# Altium schematic symbol library 13-Logicold 逻辑 IC.SchLib: 297 symbols (part 12 of 30)
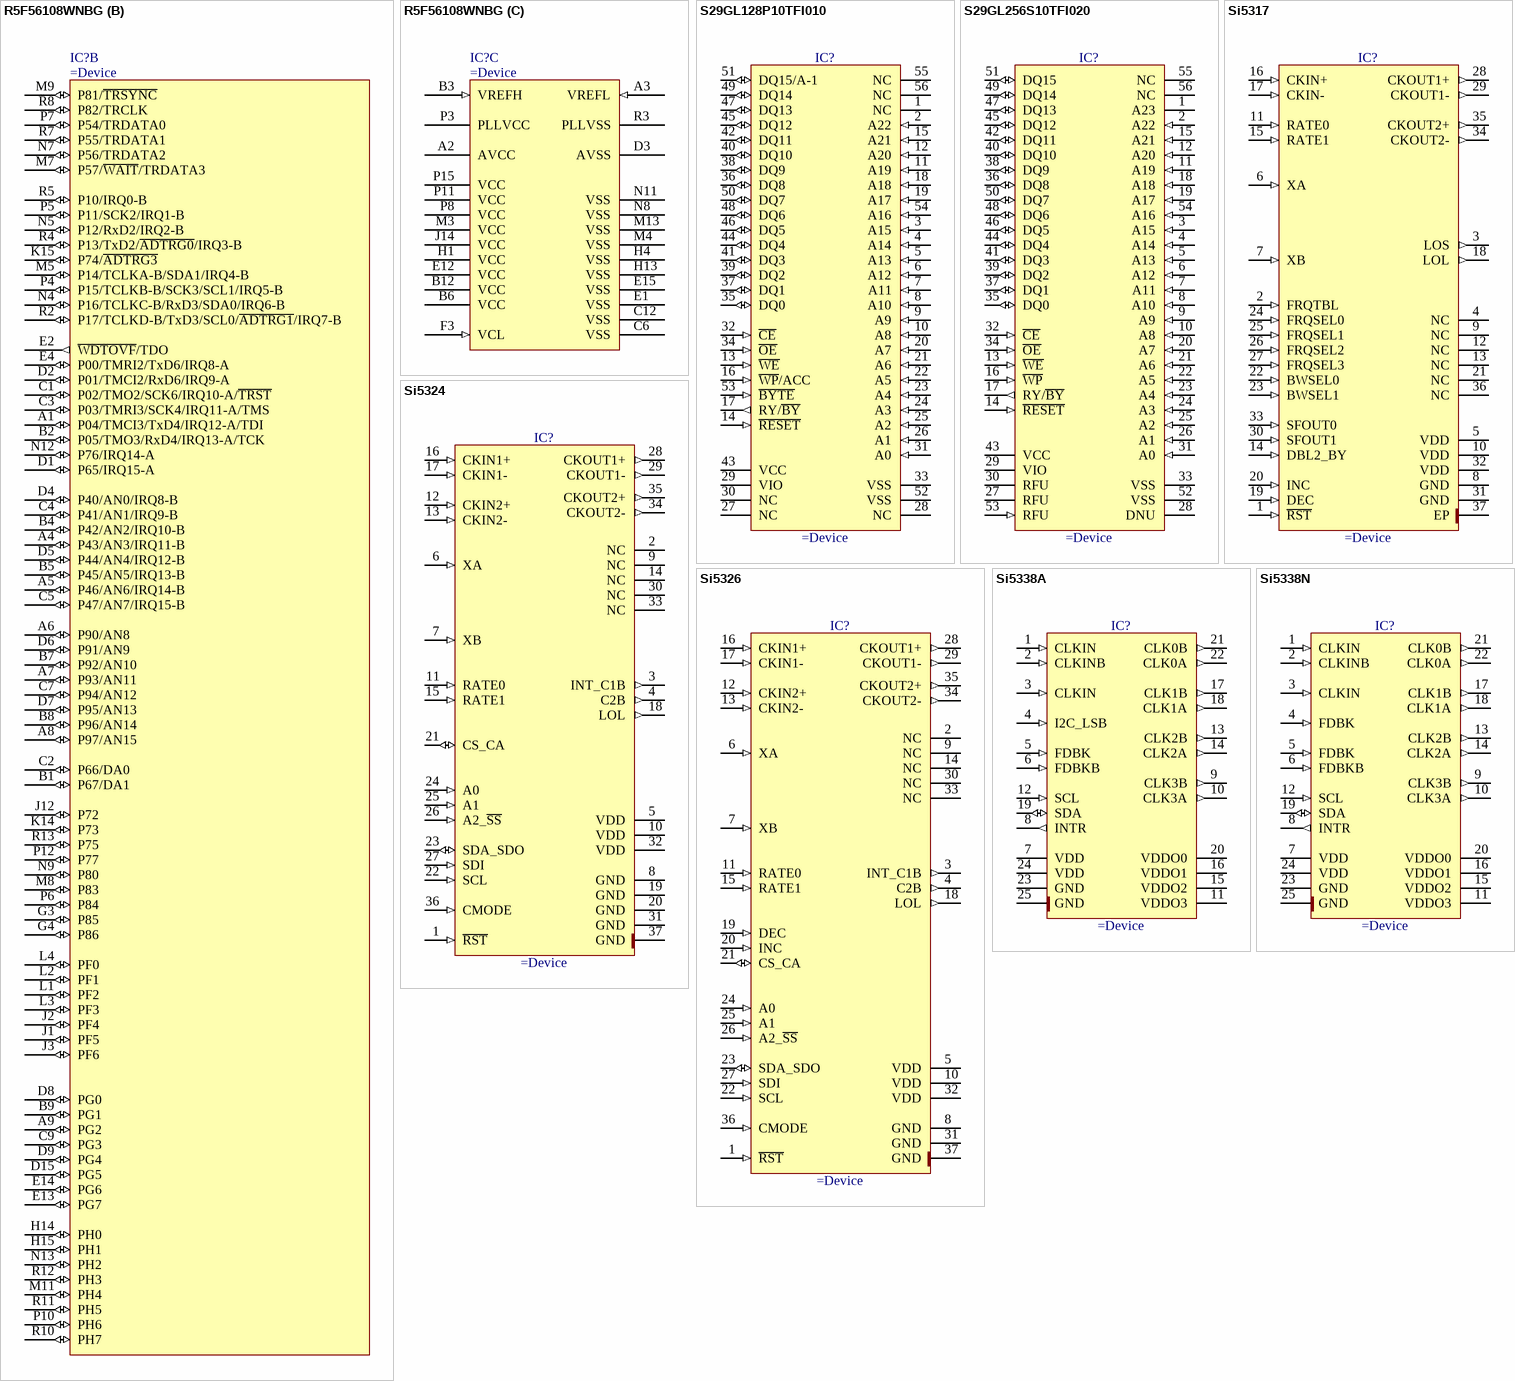
[diagram p173: symbols R5F56108WNBG to Si5338N]

## R5F56108WNBG
designator IC?
64-Bit, 2M ROM, 128K RAM, 32K Flash, 3V Microcontroller
part A pins: A10 PD1/D1 (io), A11 P60/~{CS0}/~{CS4}-A/~{CS5}-B (io), A12 P63/~{CS3}-A/~{CS7}-A (io), A13 PD4/D4 (io), A14 PD6/D6 (io), A15 PE0/D8 (io), B10 PD0/D0 (io), B11 P61/~{CS1}/~{CS2}-B/~{CS5}-A/~{CS6}-B/~{CS7}-B (io), B13 PD5/D5 (io), B14 PE1/D9 (io), B15 PE2/D10 (io), C8 BSCANP (in), C10 PD2/D2 (io), C11 P62/~{CS2}-A/~{CS6}-A (io), C13 PD7/D7 (io), C14 PE3/D11 (io), C15 PE5/D13/IRQ5-A (io), D10 PD3/D3 (io), D11 P64/~{CS4}-B (io), D12 PE4/D12 (io), D13 PE6/D14/IRQ6-A (io), D14 PE7/D15/IRQ7-A (io), E3 EMLE (in), F1 MD1 (in), F2 MD0 (in), F4 MDE (in), F12 PA3/A3/PO19/TIOCC6/TIOCD6/TCLKF (io), F13 PA2/A2/PO18/TIOCC6/TCLKE (io), F14 PA0/A0/~{BC0}/PO16/TIOCA6 (io), F15 PA1/A1/PO17/TIOCA6/TIOCB6 (io), G1 ~{RES} (in), G2 XTAL (in), G12 PA7/A7/PO23/TIOCA8/TIOCB8/TCLKH (io), G13 PA6/A6/PO22/TIOCA8 (io), G14 PA4/A4/PO20/TIOCA7 (io), G15 PA5/A5/PO21/TIOCA7/TIOCB7/TCLKG (io), H2 NMI (in), H3 EXTAL (in), H12 PB0/A8/PO24/TIOCA9 (io), J4 P34/PO12/TIOCA1/IRQ4-A (io), J13 P71/~{CS4}-C/~{CS5}-C/~{CS6}-C/~{CS7}-C (io), J15 P70/~{CS3}-B/~{ADTRG2} (io), K1 P31/PO9/TIOCA0/TIOCB0/IRQ1-A (io), K2 P30/PO8/TIOCA0/IRQ0-A (io), K3 P32/PO10/TIOCC0/TCLKA-A/IRQ2-A (io), K4 P33/PO11/TIOCC0/TIOCD0/TCLKB-A/IRQ3-A (io), K12 PB2/A10/PO26/TIOCC9 (io), K13 PB1/A9/PO25/TIOCA9/TIOCB9 (io), L12 PB7/A15/PO31/TIOCA11/TIOCB11 (io), L13 PB5/A13/PO29/TIOCA10/TIOCB10 (io), L14 PB4/A12/PO28/TIOCA10 (io), L15 PB3/A11/PO27/TIOCC9/TIOCD9 (io), M1 P27/PO7/TIOCA5/TIOCB5/SCK1 (io), M2 P26/PO6/TIOCA5/TMO1/TxD1 (io), M6 P37/PO15/TIOCA2/TIOCB2/TCLKD-A (io), M10 P51/~{WR1}/~{BC1} (io), M12 PC7/A23/TxD5/~{CS4}-D/~{CS7}-D (io), M14 PC0/A16 (io), M15 PB6/A14/PO30/TIOCA11 (io), N1 P25/PO5/TIOCA4/TMCI1/RxD1 (io), N2 P24/PO4/TIOCA4/TIOCB4/TMRI1 (io), N3 P20/PO0/TIOCA3/TIOCB3/TMRI0/TxD0 (io), N6 P36/PO14/TIOCA2 (io), N10 P50/~{WR0}/~{WR} (io), N14 PC2/A18 (io), N15 PC1/A17 (io), P1 P23/PO3/TIOCC3/TIOCD3 (io), P2 P22/PO2/TIOCC3/TMO0/SCK0 (io), P9 P52/~{RD} (io), P13 PC6/A22/RxD5/~{CS6}-D (io), P14 PC4/A20 (out), R1 P21/PO1/TIOCA3/TMCI0/RxD0 (io), R6 P35/PO13/TIOCA1/TIOCB1/TCLKC-A (io), R9 P53/BCLK (io), R14 PC5/A21/SCK5/~{CS5}-D (io), R15 PC3/A19 (io)
part B pins: A1 P04/TMCI3/TxD4/IRQ12-A/TDI (io), A4 P43/AN3/IRQ11-B (io), A5 P46/AN6/IRQ14-B (io), A6 P90/AN8 (io), A7 P93/AN11 (io), A8 P97/AN15 (io), A9 PG2 (io), B1 P67/DA1 (io), B2 P05/TMO3/RxD4/IRQ13-A/TCK (io), B4 P42/AN2/IRQ10-B (io), B5 P45/AN5/IRQ13-B (io), B7 P92/AN10 (io), B8 P96/AN14 (io), B9 PG1 (io), C1 P02/TMO2/SCK6/IRQ10-A/~{TRST} (io), C2 P66/DA0 (io), C3 P03/TMRI3/SCK4/IRQ11-A/TMS (io), C4 P41/AN1/IRQ9-B (io), C5 P47/AN7/IRQ15-B (io), C7 P94/AN12 (io), C9 PG3 (io), D1 P65/IRQ15-A (io), D2 P01/TMCI2/RxD6/IRQ9-A (io), D4 P40/AN0/IRQ8-B (io), D5 P44/AN4/IRQ12-B (io), D6 P91/AN9 (io), D7 P95/AN13 (io), D8 PG0 (io), D9 PG4 (io), D15 PG5 (io), E2 ~{WDTOVF}/TDO (out), E4 P00/TMRI2/TxD6/IRQ8-A (io), E13 PG7 (io), E14 PG6 (io), G3 P85 (io), G4 P86 (io), H14 PH0 (io), H15 PH1 (io), J1 PF5 (io), J2 PF4 (io), J3 PF6 (io), J12 P72 (io), K14 P73 (io), K15 P74/~{ADTRG3} (io), L1 PF2 (io), L2 PF1 (io), L3 PF3 (io), L4 PF0 (io), M5 P14/TCLKA-B/SDA1/IRQ4-B (io), M7 P57/~{WAIT}/TRDATA3 (io), M8 P83 (io), M9 P81/~{TRSYNC} (io), M11 PH4 (io), N4 P16/TCLKC-B/RxD3/SDA0/IRQ6-B (io), N5 P12/RxD2/IRQ2-B (io), N7 P56/TRDATA2 (io), N9 P80 (io), N12 P76/IRQ14-A (io), N13 PH2 (io), P4 P15/TCLKB-B/SCK3/SCL1/IRQ5-B (io), P5 P11/SCK2/IRQ1-B (io), P6 P84 (io), P7 P54/TRDATA0 (io), P10 PH6 (io), P12 P77 (io), R2 P17/TCLKD-B/TxD3/SCL0/~{ADTRG1}/IRQ7-B (io), R4 P13/TxD2/~{ADTRG0}/IRQ3-B (io), R5 P10/IRQ0-B (io), R7 P55/TRDATA1 (io), R8 P82/TRCLK (io), R10 PH7 (io), R11 PH5 (io), R12 PH3 (io), R13 P75 (io)
part C pins: A2 AVCC (power), A3 VREFL (in), B3 VREFH (in), B6 VCC (power), B12 VCC (power), C6 VSS (power), C12 VSS (power), D3 AVSS (power), E1 VSS (power), E12 VCC (power), E15 VSS (power), F3 VCL (in), H1 VCC (power), H4 VSS (power), H13 VSS (power), J14 VCC (power), M3 VCC (power), M4 VSS (power), M13 VSS (power), N8 VSS (power), N11 VSS (power), P3 PLLVCC (power), P8 VCC (power), P11 VCC (power), P15 VCC (power), R3 PLLVSS (power)

## S29GL128P10TFI010
designator IC?
2.7V to 3.6V, 100ns, 128 Megabit Flash Memory, 90 nm MirrorBit Process Technology
pins: 1 NC, 2 A22 (in), 3 A15 (in), 4 A14 (in), 5 A13 (in), 6 A12 (in), 7 A11 (in), 8 A10 (in), 9 A9 (in), 10 A8 (in), 11 A19 (in), 12 A20 (in), 13 ~{WE} (in), 14 ~{RESET} (in), 15 A21 (in), 16 ~{WP}/ACC (in), 17 RY/~{BY} (out), 18 A18 (in), 19 A17 (in), 20 A7 (in), 21 A6 (in), 22 A5 (in), 23 A4 (in), 24 A3 (in), 25 A2 (in), 26 A1 (in), 27 NC, 28 NC, 29 VIO (power), 30 NC, 31 A0 (in), 32 ~{CE} (in), 33 VSS (power), 34 ~{OE} (in), 35 DQ0 (io), 36 DQ8 (io), 37 DQ1 (io), 38 DQ9 (io), 39 DQ2 (io), 40 DQ10 (io), 41 DQ3 (io), 42 DQ11 (io), 43 VCC (power), 44 DQ4 (io), 45 DQ12 (io), 46 DQ5 (io), 47 DQ13 (io), 48 DQ6 (io), 49 DQ14 (io), 50 DQ7 (io), 51 DQ15/A-1 (io), 52 VSS (power), 53 ~{BYTE} (in), 54 A16 (in), 55 NC, 56 NC

## S29GL256S10TFI020
designator IC?
2.7V to 3.6V, 100ns, 256 Mbit (32Mbyte), MirrorBit Eclipse Flash Memory, 65nm  Process Technology
pins: 1 A23, 2 A22 (in), 3 A15 (in), 4 A14 (in), 5 A13 (in), 6 A12 (in), 7 A11 (in), 8 A10 (in), 9 A9 (in), 10 A8 (in), 11 A19 (in), 12 A20 (in), 13 ~{WE} (in), 14 ~{RESET} (in), 15 A21 (in), 16 ~{WP} (in), 17 RY/~{BY} (out), 18 A18 (in), 19 A17 (in), 20 A7 (in), 21 A6 (in), 22 A5 (in), 23 A4 (in), 24 A3 (in), 25 A2 (in), 26 A1 (in), 27 RFU, 28 DNU, 29 VIO (power), 30 RFU, 31 A0 (in), 32 ~{CE} (in), 33 VSS (power), 34 ~{OE} (in), 35 DQ0 (io), 36 DQ8 (io), 37 DQ1 (io), 38 DQ9 (io), 39 DQ2 (io), 40 DQ10 (io), 41 DQ3 (io), 42 DQ11 (io), 43 VCC (power), 44 DQ4 (io), 45 DQ12 (io), 46 DQ5 (io), 47 DQ13 (io), 48 DQ6 (io), 49 DQ14 (io), 50 DQ7 (io), 51 DQ15 (io), 52 VSS (power), 53 RFU (in), 54 A16 (in), 55 NC, 56 NC

## Si5317
designator IC?
Pin-Controlled Jitter Cleaning Clock
pins: 1 ~{RST} (in), 2 FRQTBL (in), 3 LOS (out), 4 NC, 5 VDD (power), 6 XA (in), 7 XB (in), 8 GND (power), 9 NC, 10 VDD (power), 11 RATE0 (in), 12 NC, 13 NC, 14 DBL2_BY (in), 15 RATE1 (in), 16 CKIN+ (in), 17 CKIN- (in), 18 LOL (out), 19 DEC (in), 20 INC (in), 21 NC, 22 BWSEL0 (in), 23 BWSEL1 (in), 24 FRQSEL0 (in), 25 FRQSEL1 (in), 26 FRQSEL2 (in), 27 FRQSEL3 (in), 28 CKOUT1+ (out), 29 CKOUT1- (out), 30 SFOUT1 (in), 31 GND (power), 32 VDD (power), 33 SFOUT0 (in), 34 CKOUT2- (out), 35 CKOUT2+ (out), 36 NC, 37 EP (power)

## Si5324
designator IC?
Any Frequency Precision Clock Multiplier/Jitter Attenuator
pins: 1 ~{RST} (in), 2 NC, 3 INT_C1B (out), 4 C2B (out), 5 VDD (power), 6 XA (in), 7 XB (in), 8 GND (power), 9 NC, 10 VDD (power), 11 RATE0 (in), 12 CKIN2+ (in), 13 CKIN2- (in), 14 NC, 15 RATE1 (in), 16 CKIN1+ (in), 17 CKIN1- (in), 18 LOL (out), 19 GND (power), 20 GND (power), 21 CS_CA (io), 22 SCL (in), 23 SDA_SDO (io), 24 A0 (in), 25 A1 (in), 26 A2_~{SS} (in), 27 SDI (in), 28 CKOUT1+ (out), 29 CKOUT1- (out), 30 NC, 31 GND (power), 32 VDD (power), 33 NC, 34 CKOUT2- (out), 35 CKOUT2+ (out), 36 CMODE (in), 37 GND (power)

## Si5326
designator IC?
Any Frequency Precision Clock Multiplier/Jitter Attenuator
pins: 1 ~{RST} (in), 2 NC, 3 INT_C1B (out), 4 C2B (out), 5 VDD (power), 6 XA (in), 7 XB (in), 8 GND (power), 9 NC, 10 VDD (power), 11 RATE0 (in), 12 CKIN2+ (in), 13 CKIN2- (in), 14 NC, 15 RATE1 (in), 16 CKIN1+ (in), 17 CKIN1- (in), 18 LOL (out), 19 DEC (in), 20 INC (in), 21 CS_CA (io), 22 SCL (in), 23 SDA_SDO (io), 24 A0 (in), 25 A1 (in), 26 A2_~{SS} (in), 27 SDI (in), 28 CKOUT1+ (out), 29 CKOUT1- (out), 30 NC, 31 GND (power), 32 VDD (power), 33 NC, 34 CKOUT2- (out), 35 CKOUT2+ (out), 36 CMODE (in), 37 GND (power)

## Si5338A
designator IC?
I2C-Programmable Any-Frequency, Any-Output Quad Clock Generator
pins: 1 CLKIN (in), 2 CLKINB (in), 3 CLKIN (in), 4 I2C_LSB (in), 5 FDBK (in), 6 FDBKB (in), 7 VDD (power), 8 INTR (out), 9 CLK3B (out), 10 CLK3A (out), 11 VDDO3 (power), 12 SCL (in), 13 CLK2B (out), 14 CLK2A (out), 15 VDDO2 (power), 16 VDDO1 (power), 17 CLK1B (out), 18 CLK1A (out), 19 SDA (io), 20 VDDO0 (power), 21 CLK0B (out), 22 CLK0A (out), 23 GND (power), 24 VDD (power), 25 GND (power)

## Si5338N
designator IC?
I2C-Programmable Any-Frequency, Any-Output Quad Clock Generator
pins: 1 CLKIN (in), 2 CLKINB (in), 3 CLKIN (in), 4 FDBK (in), 5 FDBK (in), 6 FDBKB (in), 7 VDD (power), 8 INTR (out), 9 CLK3B (out), 10 CLK3A (out), 11 VDDO3 (power), 12 SCL (in), 13 CLK2B (out), 14 CLK2A (out), 15 VDDO2 (power), 16 VDDO1 (power), 17 CLK1B (out), 18 CLK1A (out), 19 SDA (io), 20 VDDO0 (power), 21 CLK0B (out), 22 CLK0A (out), 23 GND (power), 24 VDD (power), 25 GND (power)

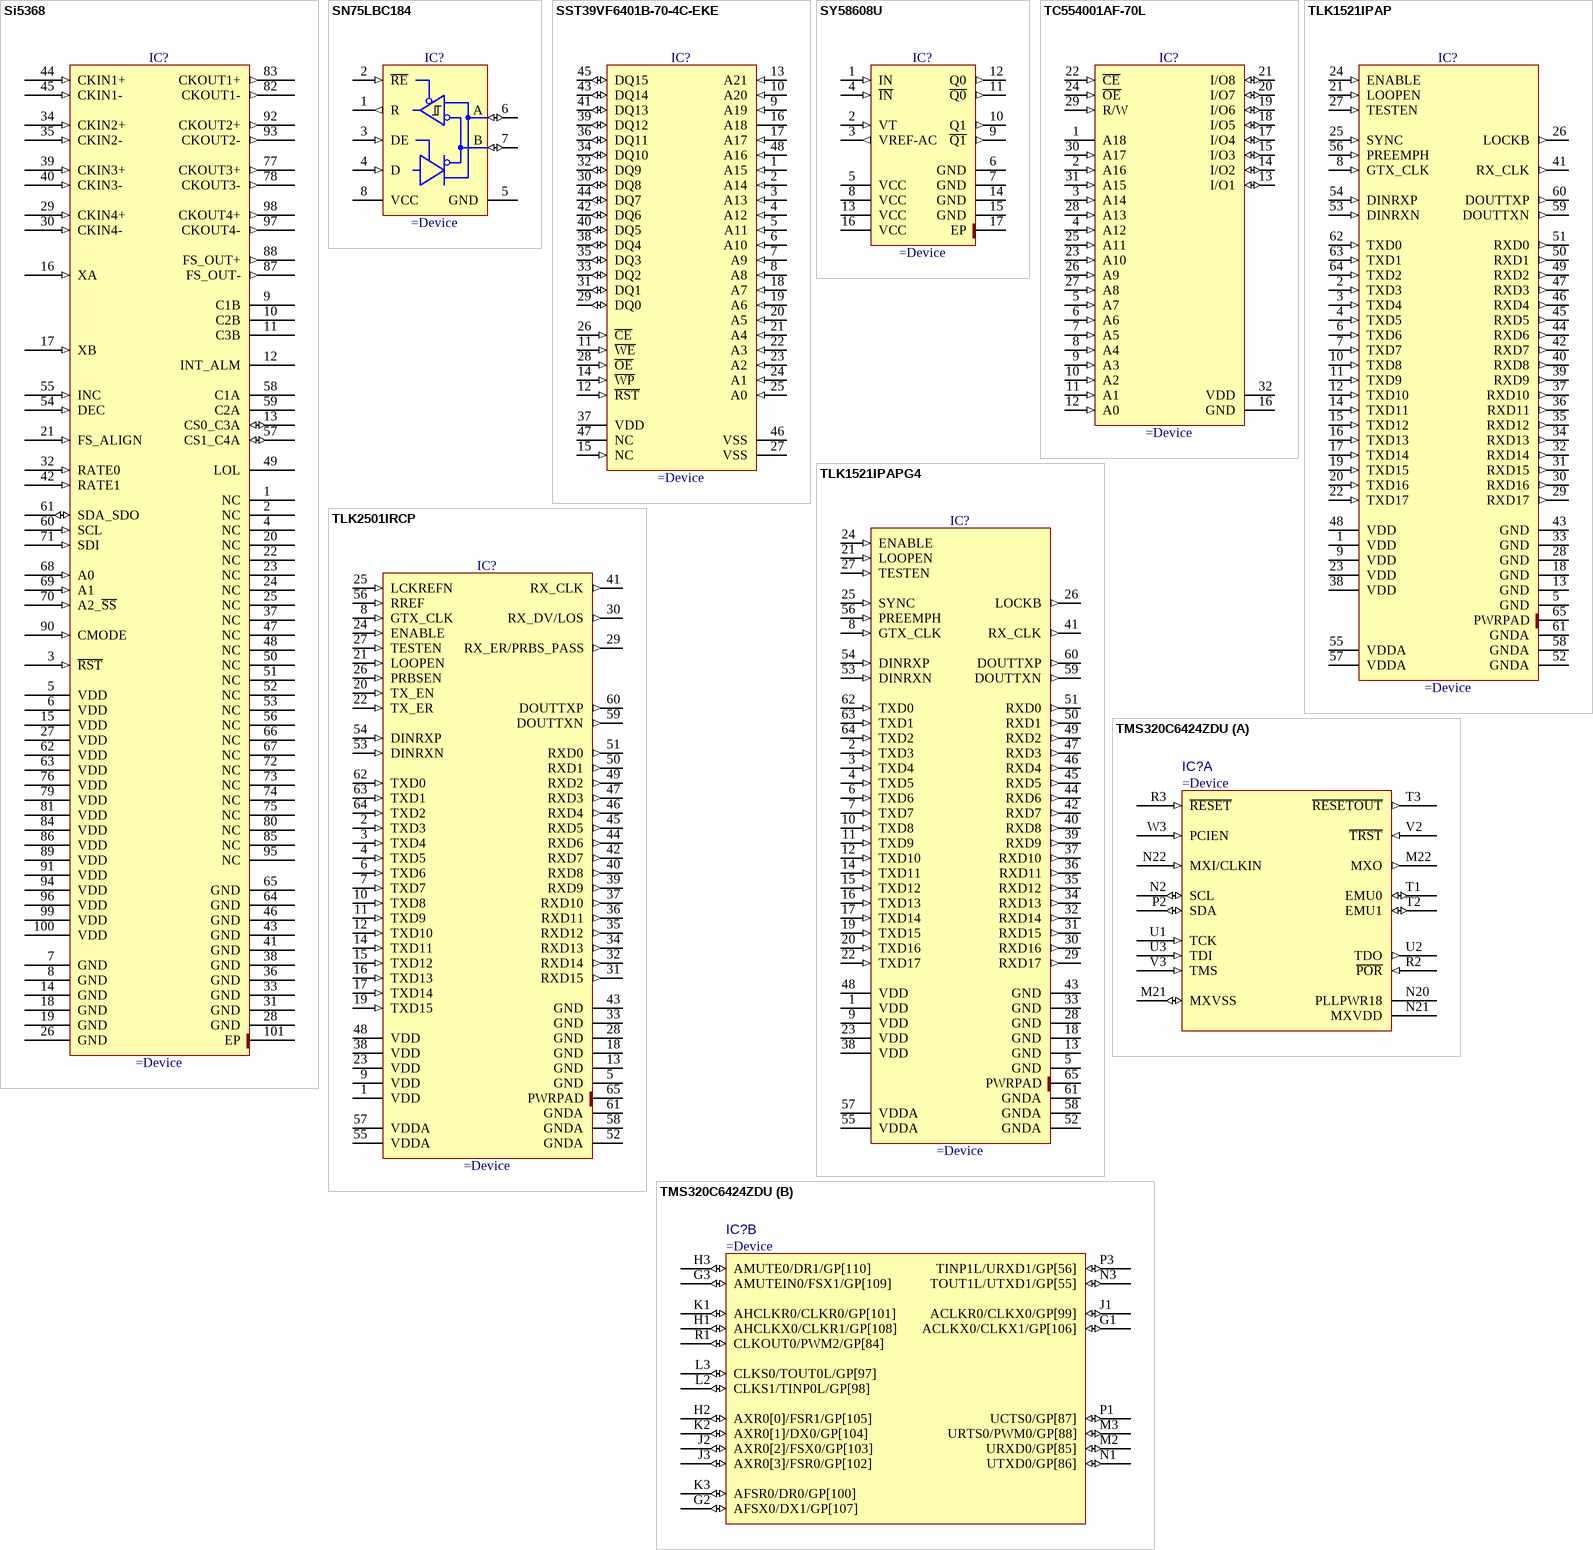
[diagram p71: symbols Si5368 to TMS320C6424ZDU]

## Si5368
designator IC?
Any-Frequency Precision Clock Multiplier/Jitter Attenuator
pins: 1 NC "No Connect", 2 NC "No Connect", 3 ~{RST} (in) "External Reset", 4 NC "No Connect", 5 VDD (power), 6 VDD (power), 7 GND (power) "Ground.", 8 GND (power) "Ground.", 9 C1B (hiz) "CKIN1 Invalid Indicator", 10 C2B (hiz) "CKIN2 Invalid Indicator.", 11 C3B (hiz) "CKIN3 Invalid Indicator.", 12 INT_ALM (hiz) "Interrupt/Alarm Output Indicator", 13 CS0_C3A (io) "Input Clock Select/CKINn Active Clock Indicator", 14 GND (power) "Ground.", 15 VDD (power), 16 XA (in) "External Crystal or Reference Clock", 17 XB (in) "External Crystal or Reference Clock", 18 GND (power) "Ground.", 19 GND (power) "Ground.", 20 NC "No Connect", 21 FS_ALIGN (in) "FSYNC Alignment Control", 22 NC "No Connect.", 23 NC "No Connect.", 24 NC "No Connect.", 25 NC "No Connect.", 26 GND (power) "Ground.", 27 VDD (power), 28 GND (power) "Ground.", 29 CKIN4+ (in) "Clock Input 4.", 30 CKIN4- (in) "Clock Input 4.", 31 GND (power) "Ground.", 32 RATE0 (in) "External Crystal or Reference Clock Rate.", 33 GND (power) "Ground.", 34 CKIN2+ (in) "Clock Input 2.", 35 CKIN2- (in) "Clock Input 2.", 36 GND (power) "Ground.", 37 NC "No Connect.", 38 GND (power) "Ground.", 39 CKIN3+ (in) "Clock Input 3.", 40 CKIN3- (in) "Clock Input 3.", 41 GND (power) "Ground.", 42 RATE1 (in) "External Crystal or Reference Clock Rate.", 43 GND (power) "Ground.", 44 CKIN1+ (in) "Clock Input 1.", 45 CKIN1- (in) "Clock Input 1.", 46 GND (power) "Ground.", 47 NC "No Connect.", 48 NC "No Connect.", 49 LOL (hiz) "PLL Loss of Lock Indicator.", 50 NC "No Connect.", 51 NC "No Connect.", 52 NC "No Connect.", 53 NC "No Connect.", 54 DEC (in) "Coarse Skew Decrement.", 55 INC (in) "Coarse Skew Increment.", 56 NC "No Connect.", 57 CS1_C4A (io) "Input Clock Select/CKINn Active Clock Indicator", 58 C1A (hiz) "CKIN1 Active Clock Indicator", 59 C2A (hiz) "CKIN2 Active Clock Indicator.", 60 SCL (in) "Serial Clock.", 61 SDA_SDO (io) "Serial Data.", 62 VDD (power), 63 VDD (power), 64 GND (power) "Ground.", 65 GND (power) "Ground.", 66 NC "No Connect.", 67 NC "No Connect.", 68 A0 (in) "Serial Port Address.", 69 A1 (in) "Serial Port Address.", 70 A2_~{SS} (in) "Serial Port Address/S\l\a\v\e\ \S\e\l\e\c\t\", 71 SDI (in) "Serial Data In.", 72 NC "No Connect.", 73 NC "No Connect.", 74 NC "No Connect.", 75 NC "No Connect.", 76 VDD (power), 77 CKOUT3+ (out) "Clock Output 3.", 78 CKOUT3- (out) "Clock Output 3.", 79 VDD (power) "VDD.", 80 NC "No Connect.", 81 VDD (power) "VDD.", 82 CKOUT1- (out) "Clock Output 1.", 83 CKOUT1+ (out) "Clock Output 1.", 84 VDD (power) "VDD.", 85 NC "No Connect.", 86 VDD (power), 87 FS_OUT- (out) "Frame Sync Output.", 88 FS_OUT+ (out) "Frame Sync Output.", 89 VDD (power) "VDD.", 90 CMODE (in) "Control Mode", 91 VDD (power), 92 CKOUT2+ (out) "Clock Output 2.", 93 CKOUT2- (out) "Clock Output 2.", 94 VDD (power) "VDD.", 95 NC "No Connect.", 96 VDD (power) "VDD.", 97 CKOUT4- (out) "Clock Output 4.", 98 CKOUT4+ (out) "Clock Output 4.", 99 VDD (power) "VDD.", 100 VDD (power) "VDD.", 101 EP (power) "Ground Pad"

## SN75LBC184
designator IC?
Differential Transceiver with Transient Voltage Suppression
pins: 1 R (out), 2 ~{RE} (in), 3 DE (in), 4 D (in), 5 GND (power), 6 A (io), 7 B (io), 8 VCC (power)

## SST39VF6401B-70-4C-EKE
designator IC?
4M x 16 (64 Mbit), 2.7V Multi-Purpose Flash Plus
pins: 1 A15 (in), 2 A14 (in), 3 A13 (in), 4 A12 (in), 5 A11 (in), 6 A10 (in), 7 A9 (in), 8 A8 (in), 9 A19 (in), 10 A20 (in), 11 ~{WE} (in), 12 ~{RST} (in), 13 A21 (in), 14 ~{WP} (in), 15 NC (in), 16 A18, 17 A17 (in), 18 A7 (in), 19 A6 (in), 20 A5 (in), 21 A4 (in), 22 A3 (in), 23 A2 (in), 24 A1 (in), 25 A0 (in), 26 ~{CE} (in), 27 VSS (power), 28 ~{OE} (in), 29 DQ0 (io), 30 DQ8 (io), 31 DQ1 (io), 32 DQ9 (io), 33 DQ2 (io), 34 DQ10 (io), 35 DQ3 (io), 36 DQ11 (io), 37 VDD (power), 38 DQ4 (io), 39 DQ12 (io), 40 DQ5 (io), 41 DQ13 (io), 42 DQ6 (io), 43 DQ14 (io), 44 DQ7 (io), 45 DQ15 (io), 46 VSS (power), 47 NC, 48 A16 (in)

## SY58608U
designator IC?
3.2Gbps Precision, 1:2 LVDS Fanout Buffer With Internal Termination And Fail Safe Input
pins: 1 IN (in), 2 VT (in), 3 VREF-AC (out), 4 ~{IN} (in), 5 VCC (power), 6 GND (power), 7 GND (power), 8 VCC (power), 9 ~{Q1} (out), 10 Q1 (out), 11 ~{Q0} (out), 12 Q0 (out), 13 VCC (power), 14 GND (power), 15 GND (power), 16 VCC (power), 17 EP (power)

## TC554001AF-70L
designator IC?
524,288-Word by 8-Bit Static RAM
pins: 1 A18, 2 A16 (in), 3 A14 (in), 4 A12 (in), 5 A7 (in), 6 A6 (in), 7 A5 (in), 8 A4 (in), 9 A3 (in), 10 A2 (in), 11 A1 (in), 12 A0 (in), 13 I/O1 (io), 14 I/O2 (io), 15 I/O3 (io), 16 GND (power), 17 I/O4 (io), 18 I/O5 (io), 19 I/O6 (io), 20 I/O7 (io), 21 I/O8 (io), 22 ~{CE} (in), 23 A10 (in), 24 ~{OE} (in), 25 A11 (in), 26 A9 (in), 27 A8 (in), 28 A13 (in), 29 R/W (in), 30 A17 (in), 31 A15 (in), 32 VDD (power)

## TLK1521IPAP
designator IC?
500Mbps to 1.3Gbps Transceiver
pins: 1 VDD (power), 2 TXD3 (in), 3 TXD4 (in), 4 TXD5 (in), 5 GND (power), 6 TXD6 (in), 7 TXD7 (in), 8 GTX_CLK (in), 9 VDD (power), 10 TXD8 (in), 11 TXD9 (in), 12 TXD10 (in), 13 GND (power), 14 TXD11 (in), 15 TXD12 (in), 16 TXD13 (in), 17 TXD14 (in), 18 GND (power), 19 TXD15 (in), 20 TXD16 (in), 21 LOOPEN (in), 22 TXD17 (in), 23 VDD (power), 24 ENABLE (in), 25 SYNC (in), 26 LOCKB (out), 27 TESTEN (in), 28 GND (power), 29 RXD17 (out), 30 RXD16 (out), 31 RXD15 (out), 32 RXD14 (out), 33 GND (power), 34 RXD13 (out), 35 RXD12 (out), 36 RXD11 (out), 37 RXD10 (out), 38 VDD (power), 39 RXD9 (out), 40 RXD8 (out), 41 RX_CLK (out), 42 RXD7 (out), 43 GND (power), 44 RXD6 (out), 45 RXD5 (out), 46 RXD4 (out), 47 RXD3 (out), 48 VDD (power), 49 RXD2 (out), 50 RXD1 (out), 51 RXD0 (out), 52 GNDA (power), 53 DINRXN (in), 54 DINRXP (in), 55 VDDA (power), 56 PREEMPH (in), 57 VDDA (power), 58 GNDA (power), 59 DOUTTXN (out), 60 DOUTTXP (out), 61 GNDA (power), 62 TXD0 (in), 63 TXD1 (in), 64 TXD2 (in), 65 PWRPAD (power)

## TLK1521IPAPG4
designator IC?
500Mbps to 1.3Gbps Transceiver
pins: 1 VDD (power), 2 TXD3 (in), 3 TXD4 (in), 4 TXD5 (in), 5 GND (power), 6 TXD6 (in), 7 TXD7 (in), 8 GTX_CLK (in), 9 VDD (power), 10 TXD8 (in), 11 TXD9 (in), 12 TXD10 (in), 13 GND (power), 14 TXD11 (in), 15 TXD12 (in), 16 TXD13 (in), 17 TXD14 (in), 18 GND (power), 19 TXD15 (in), 20 TXD16 (in), 21 LOOPEN (in), 22 TXD17 (in), 23 VDD (power), 24 ENABLE (in), 25 SYNC (in), 26 LOCKB (out), 27 TESTEN (in), 28 GND (power), 29 RXD17 (out), 30 RXD16 (out), 31 RXD15 (out), 32 RXD14 (out), 33 GND (power), 34 RXD13 (out), 35 RXD12 (out), 36 RXD11 (out), 37 RXD10 (out), 38 VDD (power), 39 RXD9 (out), 40 RXD8 (out), 41 RX_CLK (out), 42 RXD7 (out), 43 GND (power), 44 RXD6 (out), 45 RXD5 (out), 46 RXD4 (out), 47 RXD3 (out), 48 VDD (power), 49 RXD2 (out), 50 RXD1 (out), 51 RXD0 (out), 52 GNDA (power), 53 DINRXN (in), 54 DINRXP (in), 55 VDDA (power), 56 PREEMPH (in), 57 VDDA (power), 58 GNDA (power), 59 DOUTTXN (out), 60 DOUTTXP (out), 61 GNDA (power), 62 TXD0 (in), 63 TXD1 (in), 64 TXD2 (in), 65 PWRPAD (power)

## TLK2501IRCP
designator IC?
1.5 to 2.5 Gbps Transceiver
pins: 1 VDD (power), 2 TXD3 (in), 3 TXD4 (in), 4 TXD5 (in), 5 GND (power), 6 TXD6 (in), 7 TXD7 (in), 8 GTX_CLK (in), 9 VDD (power), 10 TXD8 (in), 11 TXD9 (in), 12 TXD10 (in), 13 GND (power), 14 TXD11 (in), 15 TXD12 (in), 16 TXD13 (in), 17 TXD14 (in), 18 GND (power), 19 TXD15 (in), 20 TX_EN (in), 21 LOOPEN (in), 22 TX_ER (in), 23 VDD (power), 24 ENABLE (in), 25 LCKREFN (in), 26 PRBSEN (in), 27 TESTEN (in), 28 GND (power), 29 RX_ER/PRBS_PASS (out), 30 RX_DV/LOS (out), 31 RXD15 (out), 32 RXD14 (out), 33 GND (power), 34 RXD13 (out), 35 RXD12 (out), 36 RXD11 (out), 37 RXD10 (out), 38 VDD (power), 39 RXD9 (out), 40 RXD8 (out), 41 RX_CLK (out), 42 RXD7 (out), 43 GND (power), 44 RXD6 (out), 45 RXD5 (out), 46 RXD4 (out), 47 RXD3 (out), 48 VDD (power), 49 RXD2 (out), 50 RXD1 (out), 51 RXD0 (out), 52 GNDA (power), 53 DINRXN (in), 54 DINRXP (in), 55 VDDA (power), 56 RREF (in), 57 VDDA (power), 58 GNDA (power), 59 DOUTTXN (out), 60 DOUTTXP (out), 61 GNDA (power), 62 TXD0 (in), 63 TXD1 (in), 64 TXD2 (in), 65 PWRPAD (power)

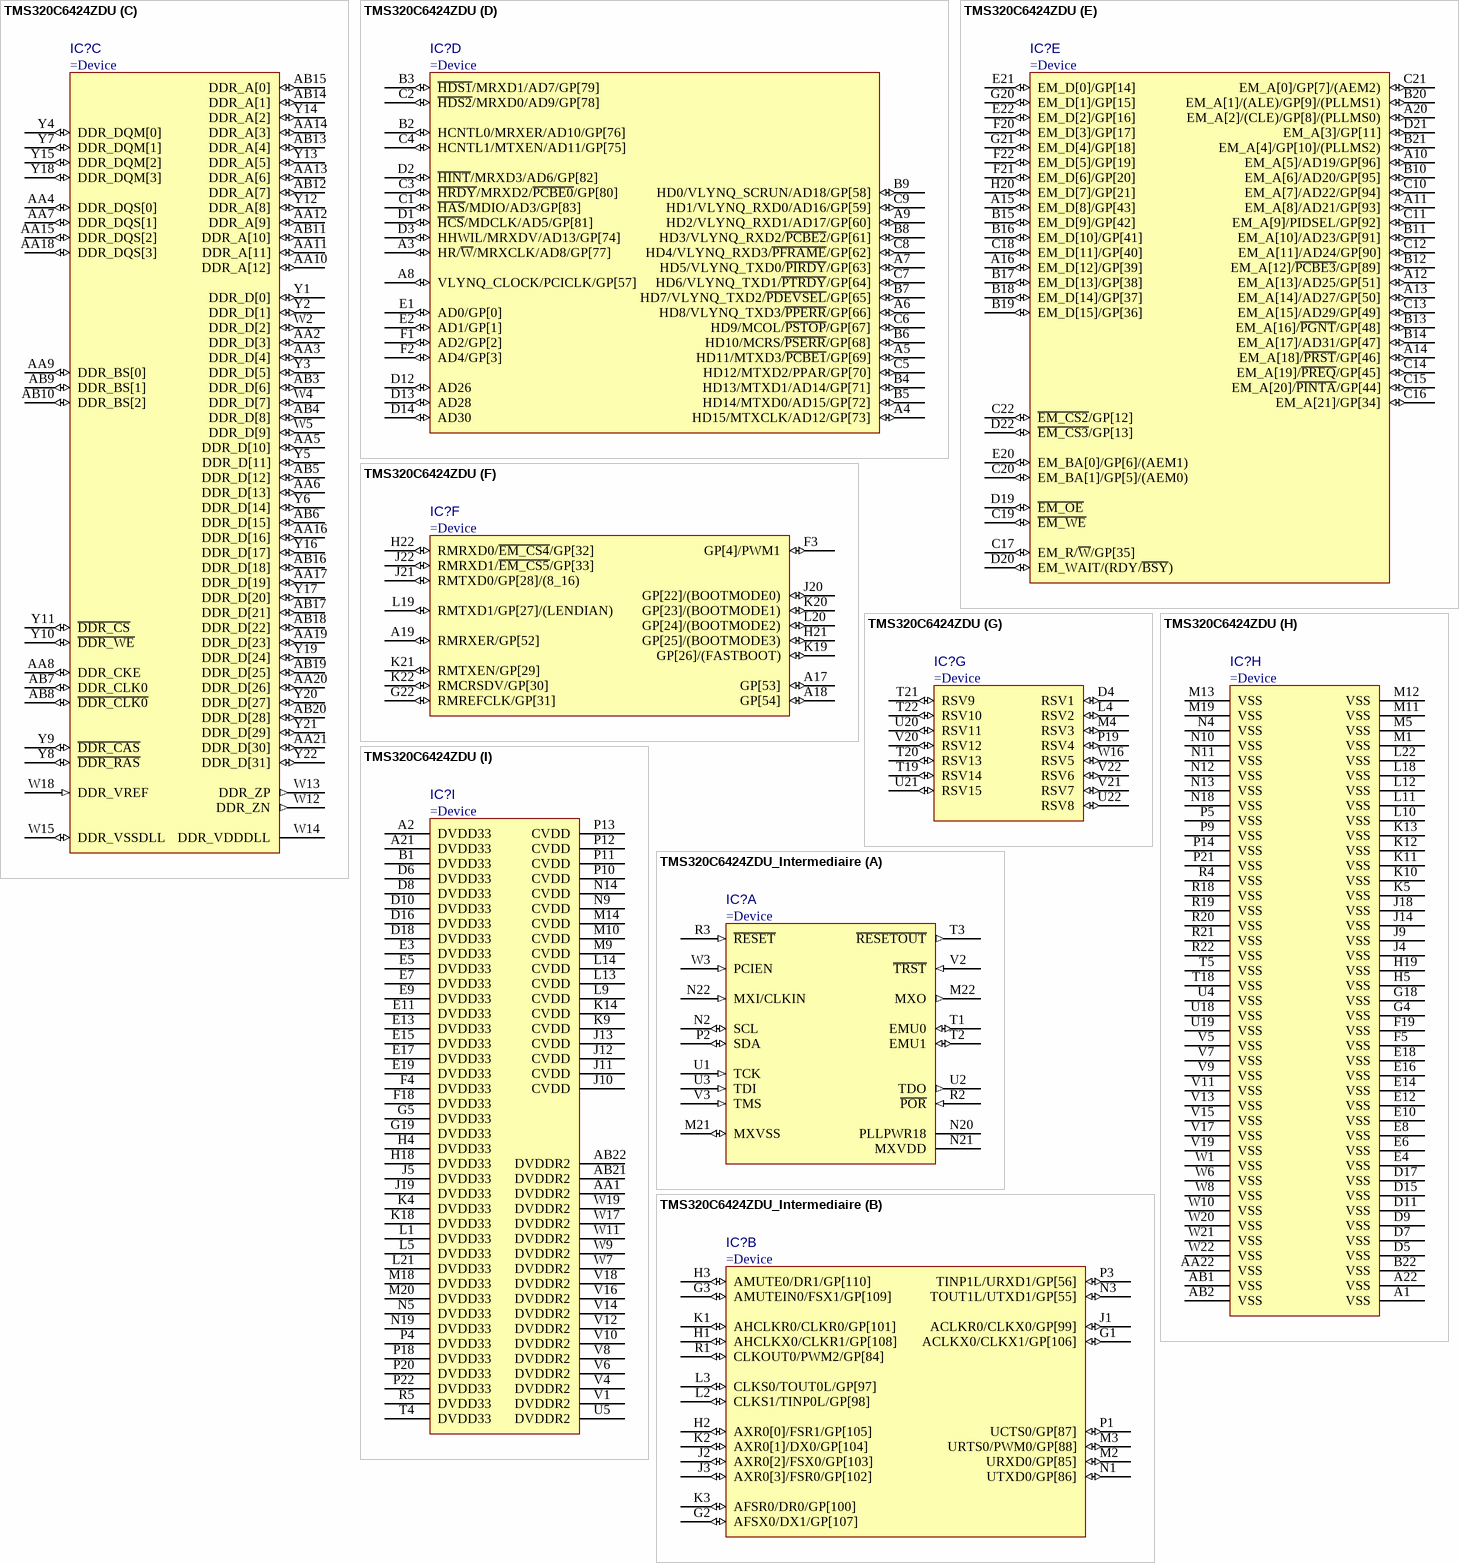
[diagram p72: symbols TMS320C6424ZDU to TMS320C6424ZDU_Intermediaire]

## TMS320C6424ZDU
designator IC?
Fixed-Point Digital Signal Processor (DSP)
part A pins: M21 MXVSS (io), M22 MXO (out), N2 SCL (io), N20 PLLPWR18 (power), N21 MXVDD (power), N22 MXI/CLKIN (in), P2 SDA (io), R2 ~{POR} (in), R3 ~{RESET} (in), T1 EMU0 (io), T2 EMU1 (io), T3 ~{RESETOUT} (out), U1 TCK (in), U2 TDO (out), U3 TDI (in), V2 ~{TRST} (in), V3 TMS (in), W3 PCIEN (in)
part B pins: G1 ACLKX0/CLKX1/GP[106] (io), G2 AFSX0/DX1/GP[107] (io), G3 AMUTEIN0/FSX1/GP[109] (io), H1 AHCLKX0/CLKR1/GP[108] (io), H2 AXR0[0]/FSR1/GP[105] (io), H3 AMUTE0/DR1/GP[110] (io), J1 ACLKR0/CLKX0/GP[99] (io), J2 AXR0[2]/FSX0/GP[103] (io), J3 AXR0[3]/FSR0/GP[102] (io), K1 AHCLKR0/CLKR0/GP[101] (io), K2 AXR0[1]/DX0/GP[104] (io), K3 AFSR0/DR0/GP[100] (io), L2 CLKS1/TINP0L/GP[98] (io), L3 CLKS0/TOUT0L/GP[97] (io), M2 URXD0/GP[85] (io), M3 URTS0/PWM0/GP[88] (io), N1 UTXD0/GP[86] (io), N3 TOUT1L/UTXD1/GP[55] (io), P1 UCTS0/GP[87] (io), P3 TINP1L/URXD1/GP[56] (io), R1 CLKOUT0/PWM2/GP[84] (io)
part C pins: AA2 DDR_D[3] (io), AA3 DDR_D[4] (io), AA4 DDR_DQS[0] (io), AA5 DDR_D[10] (io), AA6 DDR_D[13] (io), AA7 DDR_DQS[1] (io), AA8 DDR_CKE (io), AA9 DDR_BS[0] (io), AA10 DDR_A[12] (io), AA11 DDR_A[11] (io), AA12 DDR_A[9] (io), AA13 DDR_A[6] (io), AA14 DDR_A[3] (io), AA15 DDR_DQS[2] (io), AA16 DDR_D[16] (io), AA17 DDR_D[19] (io), AA18 DDR_DQS[3] (io), AA19 DDR_D[23] (io), AA20 DDR_D[26] (io), AA21 DDR_D[30] (io), AB3 DDR_D[6] (io), AB4 DDR_D[8] (io), AB5 DDR_D[12] (io), AB6 DDR_D[15] (io), AB7 DDR_CLK0 (io), AB8 ~{DDR_CLK0} (io), AB9 DDR_BS[1] (io), AB10 DDR_BS[2] (io), AB11 DDR_A[10] (io), AB12 DDR_A[7] (io), AB13 DDR_A[4] (io), AB14 DDR_A[1] (io), AB15 DDR_A[0] (io), AB16 DDR_D[18] (io), AB17 DDR_D[21] (io), AB18 DDR_D[22] (io), AB19 DDR_D[25] (io), AB20 DDR_D[28] (io), W2 DDR_D[2] (io), W4 DDR_D[7] (io), W5 DDR_D[9] (io), W12 DDR_ZN (out), W13 DDR_ZP (out), W14 DDR_VDDDLL (power), W15 DDR_VSSDLL (io), W18 DDR_VREF (in), Y1 DDR_D[0] (io), Y2 DDR_D[1] (io), Y3 DDR_D[5] (io), Y4 DDR_DQM[0] (io), Y5 DDR_D[11] (io), Y6 DDR_D[14] (io), Y7 DDR_DQM[1] (io), Y8 ~{DDR_RAS} (io), Y9 ~{DDR_CAS} (io), Y10 ~{DDR_WE} (io), Y11 ~{DDR_CS} (io), Y12 DDR_A[8] (io), Y13 DDR_A[5] (io), Y14 DDR_A[2] (io), Y15 DDR_DQM[2] (io), Y16 DDR_D[17] (io), Y17 DDR_D[20] (io), Y18 DDR_DQM[3] (io), Y19 DDR_D[24] (io), Y20 DDR_D[27] (io), Y21 DDR_D[29] (io), Y22 DDR_D[31] (io)
part D pins: A3 HR/~{W}/MRXCLK/AD8/GP[77] (io), A4 HD15/MTXCLK/AD12/GP[73] (io), A5 HD11/MTXD3/~{PCBE1}/GP[69] (io), A6 HD8/VLYNQ_TXD3/~{PPERR}/GP[66] (io), A7 HD5/VLYNQ_TXD0/~{PIRDY}/GP[63] (io), A8 VLYNQ_CLOCK/PCICLK/GP[57] (io), A9 HD2/VLYNQ_RXD1/AD17/GP[60] (io), B2 HCNTL0/MRXER/AD10/GP[76] (io), B3 ~{HDS1}/MRXD1/AD7/GP[79] (io), B4 HD13/MTXD1/AD14/GP[71] (io), B5 HD14/MTXD0/AD15/GP[72] (io), B6 HD10/MCRS/~{PSERR}/GP[68] (io), B7 HD7/VLYNQ_TXD2/~{PDEVSEL}/GP[65] (io), B8 HD3/VLYNQ_RXD2/~{PCBE2}/GP[61] (io), B9 HD0/VLYNQ_SCRUN/AD18/GP[58] (io), C1 ~{HAS}/MDIO/AD3/GP[83] (io), C2 ~{HDS2}/MRXD0/AD9/GP[78] (io), C3 ~{HRDY}/MRXD2/~{PCBE0}/GP[80] (io), C4 HCNTL1/MTXEN/AD11/GP[75] (io), C5 HD12/MTXD2/PPAR/GP[70] (io), C6 HD9/MCOL/~{PSTOP}/GP[67] (io), C7 HD6/VLYNQ_TXD1/~{PTRDY}/GP[64] (io), C8 HD4/VLYNQ_RXD3/~{PFRAME}/GP[62] (io), C9 HD1/VLYNQ_RXD0/AD16/GP[59] (io), D1 ~{HCS}/MDCLK/AD5/GP[81] (io), D2 ~{HINT}/MRXD3/AD6/GP[82] (io), D3 HHWIL/MRXDV/AD13/GP[74] (io), D12 AD26 (io), D13 AD28 (io), D14 AD30 (io), E1 AD0/GP[0] (io), E2 AD1/GP[1] (io), F1 AD2/GP[2] (io), F2 AD4/GP[3] (io)
part E pins: A10 EM_A[5]/AD19/GP[96] (io), A11 EM_A[8]/AD21/GP[93] (io), A12 EM_A[13]/AD25/GP[51] (io), A13 EM_A[14]/AD27/GP[50] (io), A14 EM_A[18]/~{PRST}/GP[46] (io), A15 EM_D[8]/GP[43] (io), A16 EM_D[12]/GP[39] (io), A20 EM_A[2]/(CLE)/GP[8]/(PLLMS0) (io), B10 EM_A[6]/AD20/GP[95] (io), B11 EM_A[10]/AD23/GP[91] (io), B12 EM_A[12]/~{PCBE3}/GP[89] (io), B13 EM_A[16]/~{PGNT}/GP[48] (io), B14 EM_A[17]/AD31/GP[47] (io), B15 EM_D[9]/GP[42] (io), B16 EM_D[10]/GP[41] (io), B17 EM_D[13]/GP[38] (io), B18 EM_D[14]/GP[37] (io), B19 EM_D[15]/GP[36] (io), B20 EM_A[1]/(ALE)/GP[9]/(PLLMS1) (io), B21 EM_A[4]/GP[10]/(PLLMS2) (io), C10 EM_A[7]/AD22/GP[94] (io), C11 EM_A[9]/PIDSEL/GP[92] (io), C12 EM_A[11]/AD24/GP[90] (io), C13 EM_A[15]/AD29/GP[49] (io), C14 EM_A[19]/~{PREQ}/GP[45] (io), C15 EM_A[20]/~{PINTA}/GP[44] (io), C16 EM_A[21]/GP[34] (io), C17 EM_R/~{W}/GP[35] (io), C18 EM_D[11]/GP[40] (io), C19 ~{EM_WE} (io), C20 EM_BA[1]/GP[5]/(AEM0) (io), C21 EM_A[0]/GP[7]/(AEM2) (io), C22 ~{EM_CS2}/GP[12] (io), D19 ~{EM_OE} (io), D20 EM_WAIT/(RDY/~{BSY}) (io), D21 EM_A[3]/GP[11] (io), D22 ~{EM_CS3}/GP[13] (io), E20 EM_BA[0]/GP[6]/(AEM1) (io), E21 EM_D[0]/GP[14] (io), E22 EM_D[2]/GP[16] (io), F20 EM_D[3]/GP[17] (io), F21 EM_D[6]/GP[20] (io), F22 EM_D[5]/GP[19] (io), G20 EM_D[1]/GP[15] (io), G21 EM_D[4]/GP[18] (io), H20 EM_D[7]/GP[21] (io)
part F pins: A17 GP[53] (io), A18 GP[54] (io), A19 RMRXER/GP[52] (io), F3 GP[4]/PWM1 (io), G22 RMREFCLK/GP[31] (io), H21 GP[25]/(BOOTMODE3) (io), H22 RMRXD0/~{EM_CS4}/GP[32] (io), J20 GP[22]/(BOOTMODE0) (io), J21 RMTXD0/GP[28]/(8_16) (io), J22 RMRXD1/~{EM_CS5}/GP[33] (io), K19 GP[26]/(FASTBOOT) (io), K20 GP[23]/(BOOTMODE1) (io), K21 RMTXEN/GP[29] (io), K22 RMCRSDV/GP[30] (io), L19 RMTXD1/GP[27]/(LENDIAN) (io), L20 GP[24]/(BOOTMODE2) (io)
part G pins: D4 RSV1 (io), L4 RSV2 (io), M4 RSV3 (io), P19 RSV4 (io), T19 RSV14 (io), T20 RSV13 (io), T21 RSV9 (io), T22 RSV10 (io), U20 RSV11 (io), U21 RSV15 (io), U22 RSV8 (io), V20 RSV12 (io), V21 RSV7 (io), V22 RSV6 (io), W16 RSV5 (io)
part H pins: A1 VSS (power), A22 VSS (power), AA22 VSS (power), AB1 VSS (power), AB2 VSS (power), B22 VSS (power), D5 VSS (power), D7 VSS (power), D9 VSS (power), D11 VSS (power), D15 VSS (power), D17 VSS (power), E4 VSS (power), E6 VSS (power), E8 VSS (power), E10 VSS (power), E12 VSS (power), E14 VSS (power), E16 VSS (power), E18 VSS (power), F5 VSS (power), F19 VSS (power), G4 VSS (power), G18 VSS (power), H5 VSS (power), H19 VSS (power), J4 VSS (power), J9 VSS (power), J14 VSS (power), J18 VSS (power), K5 VSS (power), K10 VSS (power), K11 VSS (power), K12 VSS (power), K13 VSS (power), L10 VSS (power), L11 VSS (power), L12 VSS (power), L18 VSS (power), L22 VSS (power), M1 VSS (power), M5 VSS (power), M11 VSS (power), M12 VSS (power), M13 VSS (power), M19 VSS (power), N4 VSS (power), N10 VSS (power), N11 VSS (power), N12 VSS (power), N13 VSS (power), N18 VSS (power), P5 VSS (power), P9 VSS (power), P14 VSS (power), P21 VSS (power), R4 VSS (power), R18 VSS (power), R19 VSS (power), R20 VSS (power), R21 VSS (power), R22 VSS (power), T5 VSS (power), T18 VSS (power), U4 VSS (power), U18 VSS (power), U19 VSS (power), V5 VSS (power), V7 VSS (power), V9 VSS (power), V11 VSS (power), V13 VSS (power), V15 VSS (power), V17 VSS (power), V19 VSS (power), W1 VSS (power), W6 VSS (power), W8 VSS (power), W10 VSS (power), W20 VSS (power), W21 VSS (power), W22 VSS (power)
part I pins: A2 DVDD33 (power), A21 DVDD33 (power), AA1 DVDDR2 (power), AB21 DVDDR2 (power), AB22 DVDDR2 (power), B1 DVDD33 (power), D6 DVDD33 (power), D8 DVDD33 (power), D10 DVDD33 (power), D16 DVDD33 (power), D18 DVDD33 (power), E3 DVDD33 (power), E5 DVDD33 (power), E7 DVDD33 (power), E9 DVDD33 (power), E11 DVDD33 (power), E13 DVDD33 (power), E15 DVDD33 (power), E17 DVDD33 (power), E19 DVDD33 (power), F4 DVDD33 (power), F18 DVDD33 (power), G5 DVDD33 (power), G19 DVDD33 (power), H4 DVDD33 (power), H18 DVDD33 (power), J5 DVDD33 (power), J10 CVDD (power), J11 CVDD (power), J12 CVDD (power), J13 CVDD (power), J19 DVDD33 (power), K4 DVDD33 (power), K9 CVDD (power), K14 CVDD (power), K18 DVDD33 (power), L1 DVDD33 (power), L5 DVDD33 (power), L9 CVDD (power), L13 CVDD (power), L14 CVDD (power), L21 DVDD33 (power), M9 CVDD (power), M10 CVDD (power), M14 CVDD (power), M18 DVDD33 (power), M20 DVDD33 (power), N5 DVDD33 (power), N9 CVDD (power), N14 CVDD (power), N19 DVDD33 (power), P4 DVDD33 (power), P10 CVDD (power), P11 CVDD (power), P12 CVDD (power), P13 CVDD (power), P18 DVDD33 (power), P20 DVDD33 (power), P22 DVDD33 (power), R5 DVDD33 (power), T4 DVDD33 (power), U5 DVDDR2 (power), V1 DVDDR2 (power), V4 DVDDR2 (power), V6 DVDDR2 (power), V8 DVDDR2 (power), V10 DVDDR2 (power), V12 DVDDR2 (power), V14 DVDDR2 (power), V16 DVDDR2 (power), V18 DVDDR2 (power), W7 DVDDR2 (power), W9 DVDDR2 (power), W11 DVDDR2 (power), W17 DVDDR2 (power), W19 DVDDR2 (power)